# Altium footprint library Package_SO.PcbLib: 333 footprints (part 5 of 21)
Each footprint in its own frame and in the unit in brackets; x right, y up, seen from the top. Pads: shape width x height; smd on the part's side, far side on the other; paste and mask are expansions set on the pad; w line width, h text height; cw(c..) or ccw(c..) is an arc to the next point about the centre after c.
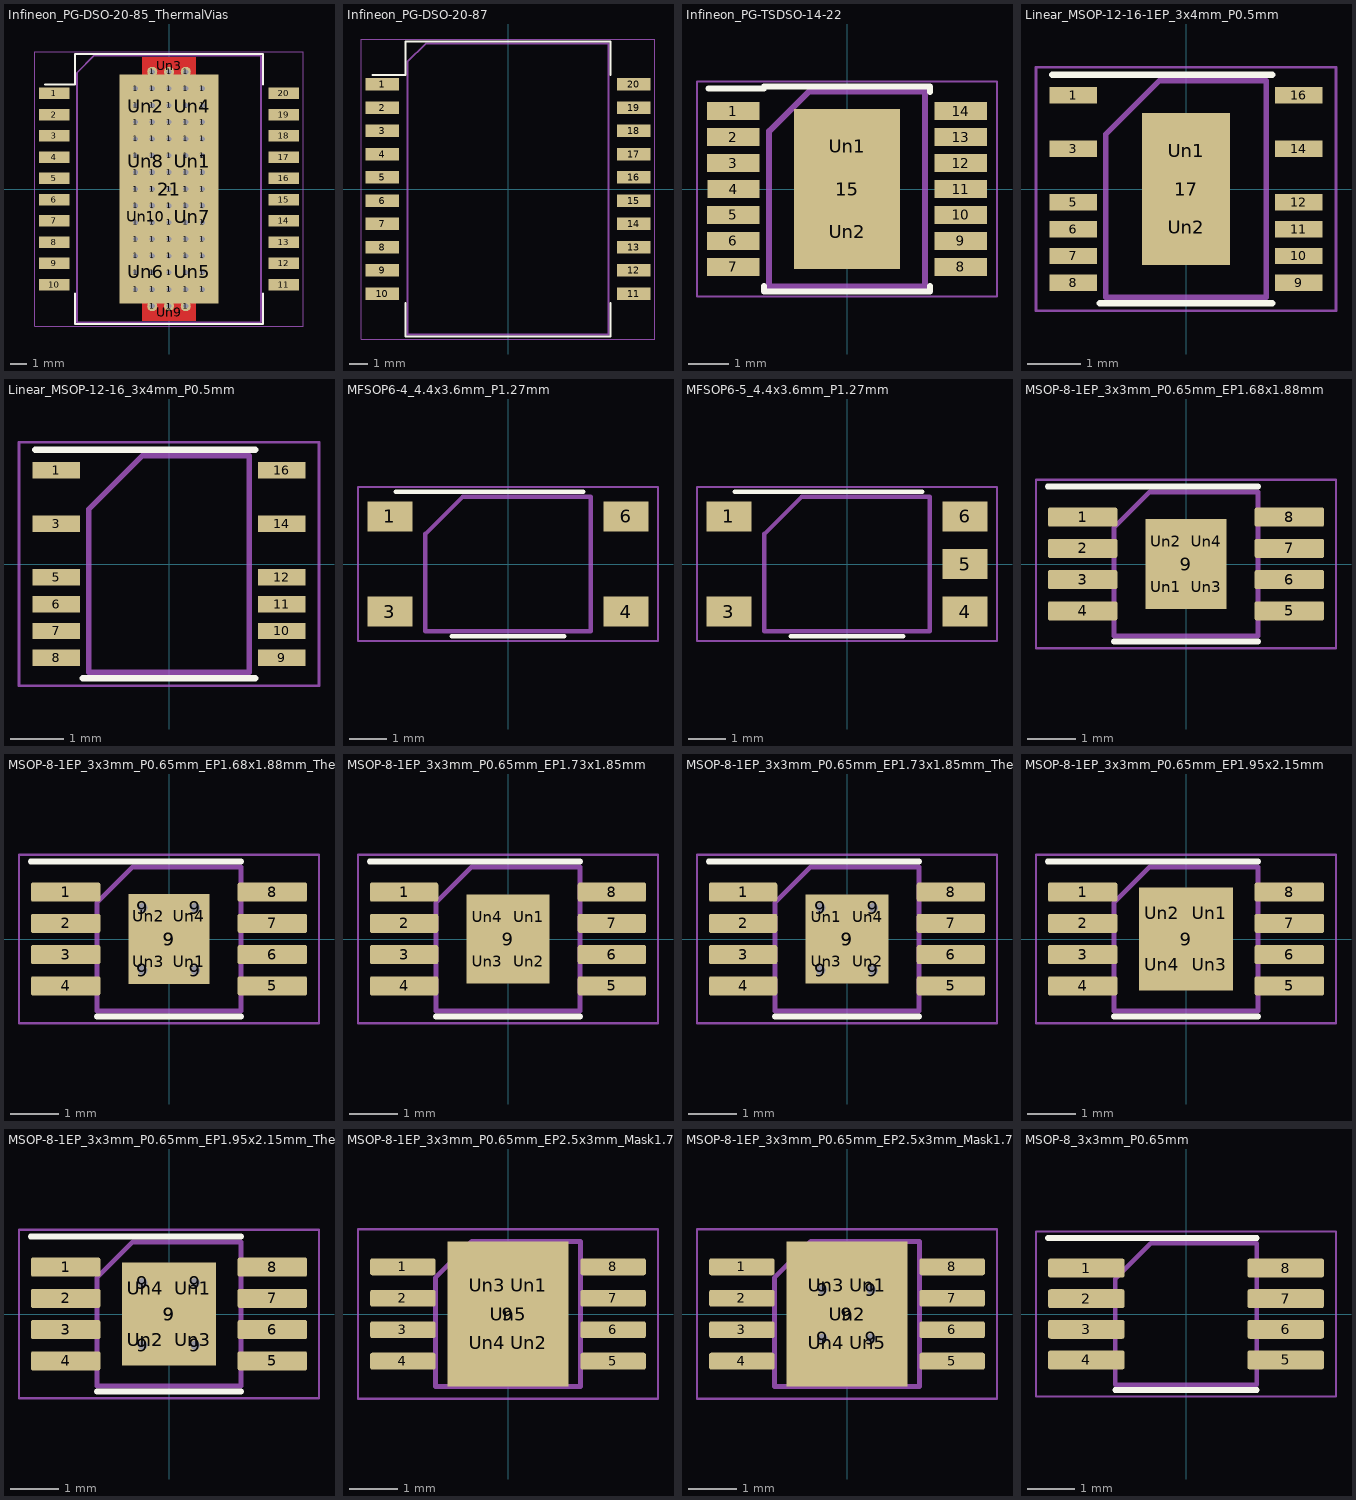
[diagram p4: the footprints below, top view; thin cyan lines are the x and y axes]

## Infineon_PG-DSO-20-85_ThermalVias [mm]
pads (113):
  rect 1.83x0.68 smd: 1(-6.865,5.715) 2(-6.865,4.445) 3(-6.865,3.175) 4(-6.865,1.905) 5(-6.865,0.635) 6(-6.865,-0.635) 7(-6.865,-1.905) 8(-6.865,-3.175) 9(-6.865,-4.445) 10(-6.865,-5.715) 11(6.865,-5.715) 12(6.865,-4.445) 13(6.865,-3.175) 14(6.865,-1.905) 15(6.865,-0.635) 16(6.865,0.635) 17(6.865,1.905) 18(6.865,3.175) 19(6.865,4.445) 20(6.865,5.715)
  round 0.6 hole 0.3: 1(-2,-6) 1(-2,-5) 1(-2,-4) 1(-2,-3) 1(-2,-2) 1(-2,-1) 1(-2,0) 1(-2,0) 1(-2,1) 1(-2,2) 1(-2,3) 1(-2,4) 1(-2,5) 1(-2,6) 1(-1,-7) 1(-1,-6) 1(-1,-5) 1(-1,-4) 1(-1,-3) 1(-1,-2) 1(-1,-1) 1(-1,0) 1(-1,0) 1(-1,1) 1(-1,2) 1(-1,3) 1(-1,4) 1(-1,5) 1(-1,6) 1(-1,7) 1(0,-7) 1(0,-7) 1(0,-6) 1(0,-6) 1(0,-5) 1(0,-5) 1(0,-4) 1(0,-4) 1(0,-3) 1(0,-3) 1(0,-2) 1(0,-2) 1(0,-1) 1(0,-1) 1(0,0) 1(0,0) 1(0,1) 1(0,2) 1(0,3) 1(0,4) 1(0,5) 1(0,6) 1(0,7) 1(1,-7) 1(1,-6) 1(1,-5) 1(1,-4) 1(1,-3) 1(1,-2) 1(1,-1) 1(1,0) 1(1,0) 1(1,1) 1(1,2) 1(1,3) 1(1,4) 1(1,5) 1(1,6) 1(1,7) 1(2,-6) 1(2,-5) 1(2,-4) 1(2,-3) 1(2,-2) 1(2,-1) 1(2,0) 1(2,1) 1(2,2) 1(2,3) 1(2,4) 1(2,5) 1(2,6)
  rect 5.9x13.7 smd: 21(0,0)
  rect 2.4x2.8 on Top Paste: Un1(1.4,1.65) Un2(-1.4,4.95) Un4(1.4,4.95) Un5(1.4,-4.95) Un6(-1.4,-4.95) Un7(1.4,-1.65) Un8(-1.4,1.65) Un10(-1.4,-1.65)
  rect 3.2x1 on Top Paste: Un3(0,7.36) Un9(0,-7.36)
F.Cu:
  region: 1.6,-7.87 -1.6,-7.87 -1.6,7.87 1.6,7.87
F.SilkS:
  lines w0.12: -7.4,6.235 -5.61,6.235 -5.61,8.06 5.61,8.06 5.61,6.235 ; -5.61,-6.235 -5.61,-8.06 5.61,-8.06 5.61,-6.235
F.Mask:
  region: 1.6,-7.87 -1.6,-7.87 -1.6,7.87 1.6,7.87
F.CrtYd:
  lines w0.05: -8.03,-8.2 -8.03,8.2 8.03,8.2 8.03,-8.2 -8.03,-8.2
F.Fab:
  lines w0.1: -5.5,-7.95 -5.5,6.95 -4.5,7.95 5.5,7.95 5.5,-7.95 -5.5,-7.95
  text "'.Designator'" at -4.047,-0.84 h1

## Infineon_PG-DSO-20-87 [mm]
pads (20):
  rect 1.83x0.68 smd: 1(-6.865,5.715) 2(-6.865,4.445) 3(-6.865,3.175) 4(-6.865,1.905) 5(-6.865,0.635) 6(-6.865,-0.635) 7(-6.865,-1.905) 8(-6.865,-3.175) 9(-6.865,-4.445) 10(-6.865,-5.715) 11(6.865,-5.715) 12(6.865,-4.445) 13(6.865,-3.175) 14(6.865,-1.905) 15(6.865,-0.635) 16(6.865,0.635) 17(6.865,1.905) 18(6.865,3.175) 19(6.865,4.445) 20(6.865,5.715)
F.SilkS:
  lines w0.12: -7.4,6.235 -5.61,6.235 -5.61,8.06 5.61,8.06 5.61,6.235 ; -5.61,-6.235 -5.61,-8.06 5.61,-8.06 5.61,-6.235
F.CrtYd:
  lines w0.05: -8.03,-8.2 8.03,-8.2 8.03,8.2 -8.03,8.2 -8.03,-8.2
F.Fab:
  lines w0.1: -5.5,-7.95 5.5,-7.95 5.5,7.95 -4.5,7.95 -5.5,6.95 -5.5,-7.95
  text "'.Designator'" at -4.047,-0.84 h1

## Infineon_PG-TSDSO-14-22 [mm]
pads (17):
  rect 1.31x0.45 smd: 1(-2.85,1.95) 2(-2.85,1.3) 3(-2.85,0.65) 4(-2.845,0) 5(-2.85,-0.65) 6(-2.85,-1.3) 7(-2.85,-1.95) 8(2.85,-1.95) 9(2.85,-1.3) 10(2.85,-0.65) 11(2.85,0) 12(2.85,0.65) 13(2.85,1.3) 14(2.85,1.95)
  rect 2.65x4 smd: 15(0,0)
  rect 2.65x1.85 on Top Paste: Un1(0,1.075) Un2(0,-1.075)
F.SilkS:
  lines w0.15: -3.475,2.525 -2.075,2.525 -2.075,2.575 2.075,2.575 2.075,2.43 ; -2.075,-2.43 -2.075,-2.575 2.075,-2.575 2.075,-2.43
F.CrtYd:
  lines w0.05: -3.76,-2.7 -3.76,2.7 3.76,2.7 3.76,-2.7 -3.76,-2.7
F.Fab:
  lines w0.15: -1.95,-2.45 1.95,-2.45 1.95,2.45 -0.95,2.45 -1.95,1.45 -1.95,-2.45
  text "'.Designator'" at -3.642,-0.756 h0.9

## Linear_MSOP-12-16-1EP_3x4mm_P0.5mm [mm]
pads (15):
  rect 0.889x0.305 smd: 1(-2.107,1.75) 3(-2.107,0.75) 5(-2.107,-0.25) 6(-2.107,-0.75) 7(-2.107,-1.25) 8(-2.107,-1.75) 9(2.107,-1.75) 10(2.107,-1.25) 11(2.107,-0.75) 12(2.107,-0.25) 14(2.107,0.75) 16(2.107,1.75)
  rect 1.651x2.845 smd: 17(0,0)
  rect 1.4x1.2 on Top Paste: Un1(0,0.711) Un2(0,-0.711)
F.SilkS:
  lines w0.12: -2.5,2.13 1.61,2.13 ; -1.61,-2.13 1.61,-2.13
F.CrtYd:
  lines w0.05: -2.8,-2.27 -2.8,2.27 2.8,2.27 2.8,-2.27 -2.8,-2.27
F.Fab:
  lines w0.1: -1.5,-2.02 1.5,-2.02 1.5,2.02 -0.5,2.02 -1.5,1.02 -1.5,-2.02
  text "'.Designator'" at -2.828,-0.583 h0.7

## Linear_MSOP-12-16_3x4mm_P0.5mm [mm]
pads (12):
  rect 0.889x0.305 smd: 1(-2.107,1.75) 3(-2.107,0.75) 5(-2.107,-0.25) 6(-2.107,-0.75) 7(-2.107,-1.25) 8(-2.107,-1.75) 9(2.107,-1.75) 10(2.107,-1.25) 11(2.107,-0.75) 12(2.107,-0.25) 14(2.107,0.75) 16(2.107,1.75)
F.SilkS:
  lines w0.12: -2.5,2.13 1.61,2.13 ; -1.61,-2.13 1.61,-2.13
F.CrtYd:
  lines w0.05: -2.8,-2.27 2.8,-2.27 2.8,2.27 -2.8,2.27 -2.8,-2.27
F.Fab:
  lines w0.1: -1.5,-2.02 -1.5,1.02 -0.5,2.02 1.5,2.02 1.5,-2.02 -1.5,-2.02
  text "'.Designator'" at -2.828,-0.583 h0.7

## MFSOP6-4_4.4x3.6mm_P1.27mm [mm]
pads (4):
  rect 1.2x0.8 smd: 1(-3.15,1.27) 3(-3.15,-1.27) 4(3.15,-1.27) 6(3.15,1.27)
F.SilkS:
  lines w0.12: -3,1.92 2,1.92 ; -1.5,-1.92 1.5,-1.92
F.CrtYd:
  lines w0.05: -4,-2.05 -4,2.05 4,2.05 4,-2.05 -4,-2.05
F.Fab:
  lines w0.12: -2.2,-1.8 2.2,-1.8 2.2,1.8 -1.2,1.8 -2.2,0.8 -2.2,-1.8
  text "'.Designator'" at -3.073,-0.668 h0.75

## MFSOP6-5_4.4x3.6mm_P1.27mm [mm]
pads (5):
  rect 1.2x0.8 smd: 1(-3.15,1.27) 3(-3.15,-1.27) 4(3.15,-1.27) 5(3.15,0) 6(3.15,1.27)
F.SilkS:
  lines w0.12: -3,1.92 2,1.92 ; -1.5,-1.92 1.5,-1.92
F.CrtYd:
  lines w0.05: -4,-2.05 -4,2.05 4,2.05 4,-2.05 -4,-2.05
F.Fab:
  lines w0.12: -2.2,-1.8 2.2,-1.8 2.2,1.8 -1.2,1.8 -2.2,0.8 -2.2,-1.8
  text "'.Designator'" at -3.073,-0.668 h0.75

## MSOP-8-1EP_3x3mm_P0.65mm_EP1.68x1.88mm [mm]
pads (13):
  rrect25% 1.45x0.4 smd: 1(-2.15,0.975) 2(-2.15,0.325) 3(-2.15,-0.325) 4(-2.15,-0.975) 5(2.15,-0.975) 6(2.15,-0.325) 7(2.15,0.325) 8(2.15,0.975)
  rect 1.68x1.88 smd: 9(0,0)
  rrect25% 0.68x0.76 on Top Paste: Un1(-0.42,-0.47) Un2(-0.42,0.47) Un3(0.42,-0.47) Un4(0.42,0.47)
F.SilkS:
  lines w0.12: -2.875,1.61 0,1.61 1.5,1.61 ; -1.5,-1.61 0,-1.61 1.5,-1.61
F.CrtYd:
  lines w0.05: -3.12,-1.75 -3.12,1.75 3.12,1.75 3.12,-1.75 -3.12,-1.75
F.Fab:
  lines w0.1: -1.5,-1.5 -1.5,0.75 -0.75,1.5 1.5,1.5 1.5,-1.5 -1.5,-1.5
  text "'.Designator'" at -3.033,-0.628 h0.75

## MSOP-8-1EP_3x3mm_P0.65mm_EP1.68x1.88mm_ThermalVias [mm]
pads (18):
  rrect25% 1.45x0.4 smd: 1(-2.15,0.975) 2(-2.15,0.325) 3(-2.15,-0.325) 4(-2.15,-0.975) 5(2.15,-0.975) 6(2.15,-0.325) 7(2.15,0.325) 8(2.15,0.975)
  round 0.5 hole 0.2: 9(-0.55,-0.65) 9(-0.55,0.65) 9(0.55,-0.65) 9(0.55,0.65)
  rect 1.68x1.88 smd: 9(0,0)
  rect 1.6x1.8 smd far side: 9(0,0)
  rrect25% 0.7x0.79 on Top Paste: Un1(0.42,-0.47) Un2(-0.42,0.47) Un3(-0.42,-0.47) Un4(0.42,0.47)
F.SilkS:
  lines w0.12: -2.875,1.61 0,1.61 1.5,1.61 ; -1.5,-1.61 0,-1.61 1.5,-1.61
F.CrtYd:
  lines w0.05: -3.12,-1.75 -3.12,1.75 3.12,1.75 3.12,-1.75 -3.12,-1.75
F.Fab:
  lines w0.1: -1.5,-1.5 1.5,-1.5 1.5,1.5 -0.75,1.5 -1.5,0.75 -1.5,-1.5
  text "'.Designator'" at -3.033,-0.628 h0.75

## MSOP-8-1EP_3x3mm_P0.65mm_EP1.73x1.85mm [mm]
pads (13):
  rrect25% 1.425x0.4 smd: 1(-2.163,0.975) 2(-2.163,0.325) 3(-2.163,-0.325) 4(-2.163,-0.975) 5(2.163,-0.975) 6(2.163,-0.325) 7(2.163,0.325) 8(2.163,0.975)
  rect 1.73x1.85 smd: 9(0,0)
  rrect25% 0.7x0.75 on Top Paste: Un1(0.43,0.46) Un2(0.43,-0.46) Un3(-0.43,-0.46) Un4(-0.43,0.46)
F.SilkS:
  lines w0.12: -2.875,1.61 0,1.61 1.5,1.61 ; -1.5,-1.61 0,-1.61 1.5,-1.61
F.CrtYd:
  lines w0.05: -3.12,-1.75 -3.12,1.75 3.12,1.75 3.12,-1.75 -3.12,-1.75
F.Fab:
  lines w0.1: -1.5,-1.5 -1.5,0.75 -0.75,1.5 1.5,1.5 1.5,-1.5 -1.5,-1.5
  text "'.Designator'" at -3.033,-0.628 h0.75

## MSOP-8-1EP_3x3mm_P0.65mm_EP1.73x1.85mm_ThermalVias [mm]
pads (18):
  rrect25% 1.425x0.4 smd: 1(-2.163,0.975) 2(-2.163,0.325) 3(-2.163,-0.325) 4(-2.163,-0.975) 5(2.163,-0.975) 6(2.163,-0.325) 7(2.163,0.325) 8(2.163,0.975)
  round 0.5 hole 0.2: 9(-0.55,-0.65) 9(-0.55,0.65) 9(0.55,-0.65) 9(0.55,0.65)
  rect 1.6x1.8 smd far side: 9(0,0)
  rect 1.73x1.85 smd: 9(0,0)
  rrect25% 0.72x0.77 on Top Paste: Un1(-0.43,0.46) Un2(0.43,-0.46) Un3(-0.43,-0.46) Un4(0.43,0.46)
F.SilkS:
  lines w0.12: -2.875,1.61 0,1.61 1.5,1.61 ; -1.5,-1.61 0,-1.61 1.5,-1.61
F.CrtYd:
  lines w0.05: -3.12,-1.75 -3.12,1.75 3.12,1.75 3.12,-1.75 -3.12,-1.75
F.Fab:
  lines w0.1: -1.5,-1.5 1.5,-1.5 1.5,1.5 -0.75,1.5 -1.5,0.75 -1.5,-1.5
  text "'.Designator'" at -3.033,-0.628 h0.75

## MSOP-8-1EP_3x3mm_P0.65mm_EP1.95x2.15mm [mm]
pads (13):
  rrect25% 1.45x0.4 smd: 1(-2.15,0.975) 2(-2.15,0.325) 3(-2.15,-0.325) 4(-2.15,-0.975) 5(2.15,-0.975) 6(2.15,-0.325) 7(2.15,0.325) 8(2.15,0.975)
  rect 1.95x2.15 smd: 9(0,0)
  rrect25% 0.79x0.87 on Top Paste: Un1(0.49,0.54) Un2(-0.49,0.54) Un3(0.49,-0.54) Un4(-0.49,-0.54)
F.SilkS:
  lines w0.12: -2.875,1.61 0,1.61 1.5,1.61 ; -1.5,-1.61 0,-1.61 1.5,-1.61
F.CrtYd:
  lines w0.05: -3.12,-1.75 3.12,-1.75 3.12,1.75 -3.12,1.75 -3.12,-1.75
F.Fab:
  lines w0.1: -1.5,-1.5 -1.5,0.75 -0.75,1.5 1.5,1.5 1.5,-1.5 -1.5,-1.5
  text "'.Designator'" at -3.033,-0.628 h0.75

## MSOP-8-1EP_3x3mm_P0.65mm_EP1.95x2.15mm_ThermalVias [mm]
pads (18):
  rrect25% 1.45x0.4 smd: 1(-2.15,0.975) 2(-2.15,0.325) 3(-2.15,-0.325) 4(-2.15,-0.975) 5(2.15,-0.975) 6(2.15,-0.325) 7(2.15,0.325) 8(2.15,0.975)
  round 0.5 hole 0.2: 9(-0.55,-0.65) 9(-0.55,0.65) 9(0.55,-0.65) 9(0.55,0.65)
  rect 1.95x2.15 smd: 9(0,0)
  rect 1.6x1.8 smd far side: 9(0,0)
  rrect25% 0.82x0.9 on Top Paste: Un1(0.49,0.54) Un2(-0.49,-0.54) Un3(0.49,-0.54) Un4(-0.49,0.54)
F.SilkS:
  lines w0.12: -2.875,1.61 0,1.61 1.5,1.61 ; -1.5,-1.61 0,-1.61 1.5,-1.61
F.CrtYd:
  lines w0.05: -3.12,-1.75 -3.12,1.75 3.12,1.75 3.12,-1.75 -3.12,-1.75
F.Fab:
  lines w0.1: -1.5,-1.5 1.5,-1.5 1.5,1.5 -0.75,1.5 -1.5,0.75 -1.5,-1.5
  text "'.Designator'" at -3.033,-0.628 h0.75

## MSOP-8-1EP_3x3mm_P0.65mm_EP2.5x3mm_Mask1.73x2.36mm [mm]
pads (14):
  rrect25% 1.35x0.35 smd: 1(-2.175,0.975) 2(-2.175,0.325) 3(-2.175,-0.325) 4(-2.175,-0.975) 5(2.175,-0.975) 6(2.175,-0.325) 7(2.175,0.325) 8(2.175,0.975)
  rect 2.5x3 smd: 9(0,0)
  rrect25% 0.7x0.95 on Top Paste: Un1(0.43,0.59) Un2(0.43,-0.59) Un3(-0.43,0.59) Un4(-0.43,-0.59)
  rect 1.73x2.36 on Top Solder: Un5(0,0)
F.CrtYd:
  lines w0.05: -3.1,-1.75 -3.1,1.75 3.1,1.75 3.1,-1.75 -3.1,-1.75
F.Fab:
  lines w0.1: -1.5,-1.5 -1.5,0.75 -0.75,1.5 1.5,1.5 1.5,-1.5 -1.5,-1.5
  text "'.Designator'" at -3.033,-0.628 h0.75

## MSOP-8-1EP_3x3mm_P0.65mm_EP2.5x3mm_Mask1.73x2.36mm_ThermalVias [mm]
pads (19):
  rrect25% 1.35x0.35 smd: 1(-2.175,0.975) 2(-2.175,0.325) 3(-2.175,-0.325) 4(-2.175,-0.975) 5(2.175,-0.975) 6(2.175,-0.325) 7(2.175,0.325) 8(2.175,0.975)
  round 0.5 hole 0.2: 9(-0.5,-0.5) 9(-0.5,0.5) 9(0.5,-0.5) 9(0.5,0.5)
  rect 1.5x1.5 smd far side: 9(0,0)
  rect 2.5x3 smd: 9(0,0)
  rrect25% 0.72x0.99 on Top Paste: Un1(0.43,0.59) Un3(-0.43,0.59) Un4(-0.43,-0.59) Un5(0.43,-0.59)
  rect 1.73x2.36 on Top Solder: Un2(0,0)
F.CrtYd:
  lines w0.05: -3.1,-1.75 3.1,-1.75 3.1,1.75 -3.1,1.75 -3.1,-1.75
F.Fab:
  lines w0.1: -1.5,-1.5 -1.5,0.75 -0.75,1.5 1.5,1.5 1.5,-1.5 -1.5,-1.5
  text "'.Designator'" at -3.033,-0.628 h0.75

## MSOP-8_3x3mm_P0.65mm [mm]
pads (8):
  rrect25% 1.625x0.4 smd: 1(-2.113,0.975) 2(-2.113,0.325) 3(-2.113,-0.325) 4(-2.113,-0.975) 5(2.113,-0.975) 6(2.113,-0.325) 7(2.113,0.325) 8(2.113,0.975)
F.SilkS:
  lines w0.12: -2.925,1.61 0,1.61 1.5,1.61 ; -1.5,-1.61 0,-1.61 1.5,-1.61
F.CrtYd:
  lines w0.05: -3.18,-1.75 -3.18,1.75 3.18,1.75 3.18,-1.75 -3.18,-1.75
F.Fab:
  lines w0.1: -1.5,-1.5 -1.5,0.75 -0.75,1.5 1.5,1.5 1.5,-1.5 -1.5,-1.5
  text "'.Designator'" at -3.033,-0.628 h0.75